# Altium footprint library 3M THD.PcbLib: 163 footprints (part 3 of 14)
Each footprint in its own frame and in the unit in brackets; x right, y up, seen from the top. Pads: shape width x height; smd on the part's side, far side on the other; paste and mask are expansions set on the pad; w line width, h text height; cw(c..) or ccw(c..) is an arc to the next point about the centre after c.
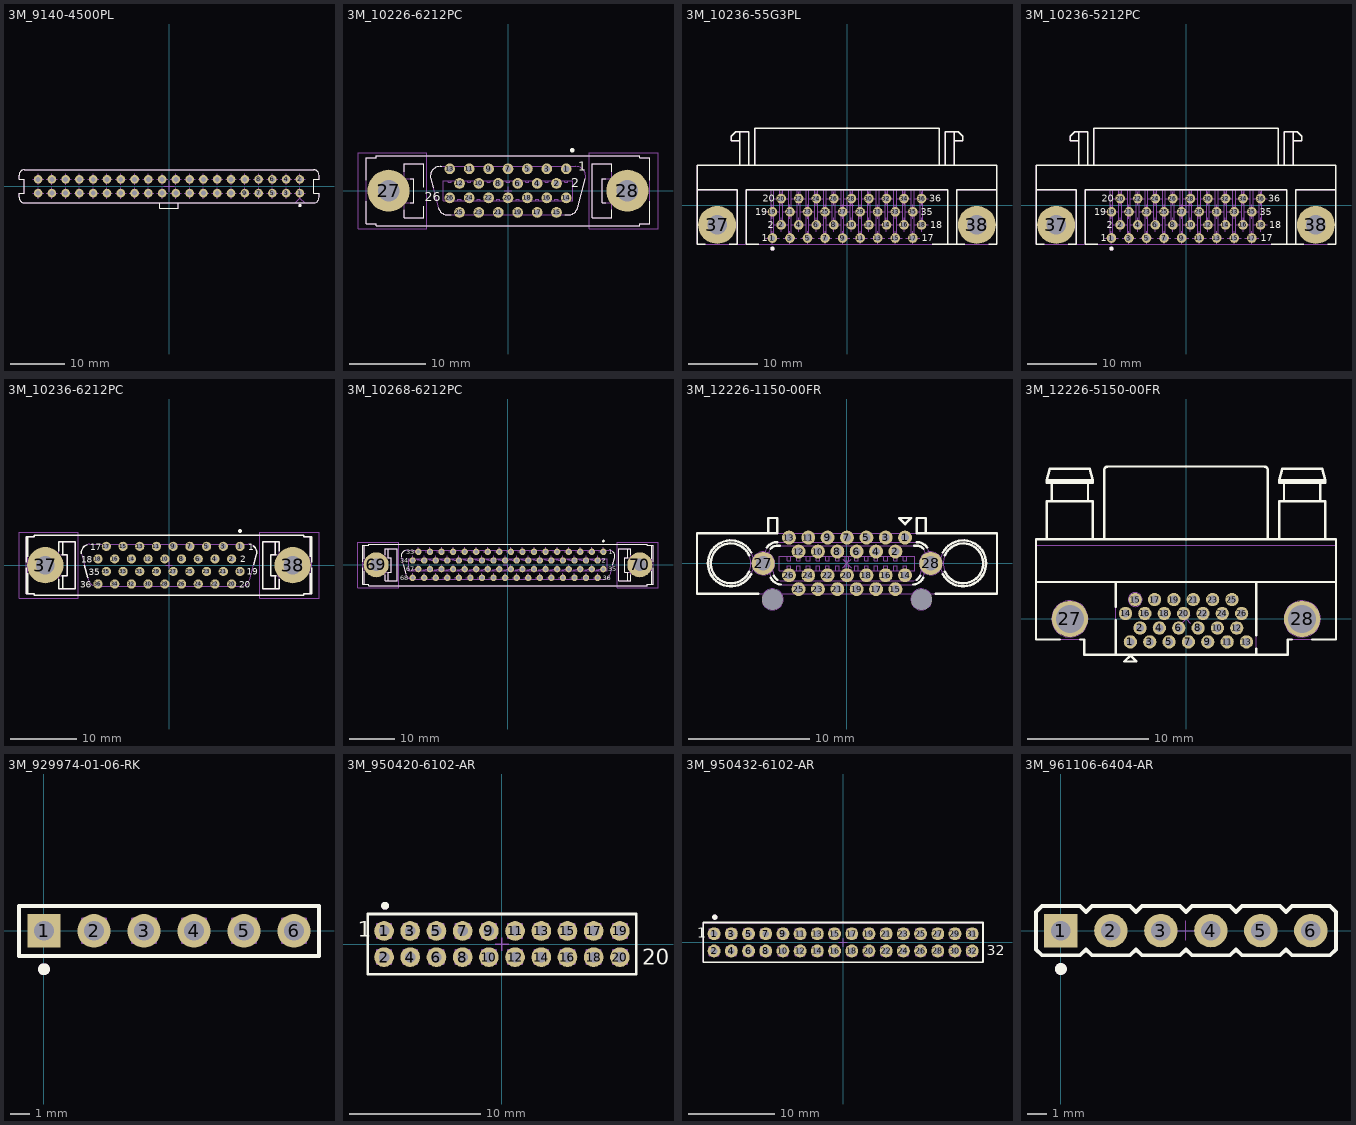
[diagram p2: the footprints below, top view; thin cyan lines are the x and y axes]

## 3M_9140-4500PL [mm] "40 Contacts - Straight .100\" x .100\" Polarized Boardmount Socket, 9100 Series"
height 9
pads (40):
  round 1.6 hole 0.9: 1(24.13,-1.27) 2(24.13,1.27) 3(21.59,-1.27) 4(21.59,1.27) 5(19.05,-1.27) 6(19.05,1.27) 7(16.51,-1.27) 8(16.51,1.27) 9(13.97,-1.27) 10(13.97,1.27) 11(11.43,-1.27) 12(11.43,1.27) 13(8.89,-1.27) 14(8.89,1.27) 15(6.35,-1.27) 16(6.35,1.27) 17(3.81,-1.27) 18(3.81,1.27) 19(1.27,-1.27) 20(1.27,1.27) 21(-1.27,-1.27) 22(-1.27,1.27) 23(-3.81,-1.27) 24(-3.81,1.27) 25(-6.35,-1.27) 26(-6.35,1.27) 27(-8.89,-1.27) 28(-8.89,1.27) 29(-11.43,-1.27) 30(-11.43,1.27) 31(-13.97,-1.27) 32(-13.97,1.27) 33(-16.51,-1.27) 34(-16.51,1.27) 35(-19.05,-1.27) 36(-19.05,1.27) 37(-21.59,-1.27) 38(-21.59,1.27) 39(-24.13,-1.27) 40(-24.13,1.27)
Top Overlay:
  circle w0.3: c24.13,-3.556 r0.15
  lines w0.2: -1.69,-3.05 -1.69,-4.05 1.71,-4.05 1.71,-3.05 ; 23.266,-3.05 24.994,-3.05 ; -27.65,-2.05 ccw(c-26.65,-2.05) -26.65,-3.05 26.65,-3.05 ccw(c26.65,-2.05) 27.65,-2.05 27.65,-1.27 26.65,-1.27 26.65,1.27 27.65,1.27 27.65,2.05 ccw(c26.65,2.05) 26.65,3.05 -26.65,3.05 ccw(c-26.65,2.05) -27.65,2.05 -27.65,1.27 -26.65,1.27 -26.65,-1.27 -27.65,-1.27 ; -27.65,-2.05 -27.65,-1.27 ; -27.65,-2.05 -27.65,-1.27
Mechanical 8:
  drawing of 164 lines, arcs and shapes, not listed
Mechanical 14:
  circle w0.3: c24.13,-3.556 r0.15
  lines w0.1: -1.69,-3.05 -1.69,-4.05 1.71,-4.05 1.71,-3.05 ; 23.266,-3.05 24.13,-2.186 24.994,-3.05 ; -27.65,-2.05 ccw(c-26.65,-2.05) -26.65,-3.05 26.65,-3.05 ccw(c26.65,-2.05) 27.65,-2.05 27.65,-1.27 26.65,-1.27 26.65,1.27 27.65,1.27 27.65,2.05 ccw(c26.65,2.05) 26.65,3.05 -26.65,3.05 ccw(c-26.65,2.05) -27.65,2.05 -27.65,1.27 -26.65,1.27 -26.65,-1.27 -27.65,-1.27 ; -27.65,-2.05 -27.65,-1.27 ; -27.65,-2.05 -27.65,-1.27
3D body "3M_9140-4500PL.stp": height 9, standoff -2.8, extent -27.65,-4.05 27.65,3.05

## 3M_10226-6212PC [mm] "26 contacts, Mini D Ribbon (MDR), .050\" Boardmount Through-hole Vertical Receptacle - Shielded"
height 11
pads (28):
  round 1.4 hole 0.8: 1(7.62,2.86) 2(6.35,0.955) 3(5.08,2.86) 4(3.81,0.955) 5(2.54,2.86) 6(1.27,0.955) 7(0,2.86) 8(-1.27,0.955) 9(-2.54,2.86) 10(-3.81,0.955) 11(-5.08,2.86) 12(-6.35,0.955) 13(-7.62,2.86) 14(7.62,-0.94) 15(6.35,-2.84) 16(5.08,-0.94) 17(3.81,-2.84) 18(2.54,-0.94) 19(1.27,-2.84) 20(0,-0.94) 21(-1.27,-2.84) 22(-2.54,-0.94) 23(-3.81,-2.84) 24(-5.08,-0.94) 25(-6.35,-2.84) 26(-7.62,-0.94)
  round 5.5 hole 2.8: 27(-15.63,0) 28(15.63,0)
Top Overlay:
  circle w0.3: c8.4,5.3 r0.15
  lines w0.1: -18.542,-1.4 -18.542,-4.318 -17.272,-4.318 -17.272,-4.572 17.272,-4.572 17.272,-4.318 18.542,-4.318 18.542,-1.4 ; -18.542,1.4 -18.542,4.318 -17.272,4.318 -17.272,4.572 17.272,4.572 17.272,4.318 18.542,4.318 18.542,1.4 ; -13.589,-2.5 -13.589,-3.556 -11.049,-3.556 -11.049,-2 ; -13.589,2.5 -13.589,3.556 -11.049,3.556 -11.049,0.424 ; -12.8,-1.587 -12.319,-1.587 -12.319,1.587 -12.8,1.587 ; -9.795,0.375 -10.117,1.576 cw(c-8.89,1.905) -8.89,3.175 -8.674,3.175 ; -9.096,-2.234 ccw(c-7.869,-1.905) -7.869,-3.175 -7.402,-3.175 ; 7.402,-3.175 7.869,-3.175 ccw(c7.869,-1.905) 9.096,-2.234 10.117,1.576 ; 12.8,-1.587 12.319,-1.587 12.319,1.587 12.8,1.587 ; 13.589,-2.5 13.589,-3.556 11.049,-3.556 11.049,3.556 13.589,3.556 13.589,2.5
  text "26" at -10.9,-1.4 h1.2
  text "2" at 8.3,0.455 h1.2
  text "1" at 9.2,2.6 h1.2
Mechanical 8:
  circle w0.1: c-15.63,0 r1.4
  circle w0.1: c15.63,0 r1.4
  lines w0.1: -16.13,0 -15.63,0 ; -15.63,-0.5 -15.63,0 ; -15.63,0.5 -15.63,0 ; -15.13,0 -15.63,0 ; -8.12,-0.95 -7.62,-0.95 ; -8.12,2.86 -7.62,2.86 ; -7.62,-1.45 -7.62,-0.95 ; -7.62,-0.45 -7.62,-0.95 ; -7.62,2.36 -7.62,2.86 ; -7.62,3.36 -7.62,2.86 ; -7.12,-0.95 -7.62,-0.95 ; -7.12,2.86 -7.62,2.86 ; -6.85,-2.855 -6.35,-2.855 ; -6.85,0.955 -6.35,0.955 ; -6.35,-3.355 -6.35,-2.855 ; -6.35,-2.355 -6.35,-2.855 ; -6.35,0.455 -6.35,0.955 ; -6.35,1.455 -6.35,0.955 ; -5.85,-2.855 -6.35,-2.855 ; -5.85,0.955 -6.35,0.955 ; -5.58,-0.95 -5.08,-0.95 ; -5.58,2.86 -5.08,2.86 ; -5.08,-1.45 -5.08,-0.95 ; -5.08,-0.45 -5.08,-0.95 ; -5.08,2.36 -5.08,2.86 ; -5.08,3.36 -5.08,2.86 ; -4.58,-0.95 -5.08,-0.95 ; -4.58,2.86 -5.08,2.86 ; -4.31,-2.855 -3.81,-2.855 ; -4.31,0.955 -3.81,0.955 ; -3.81,-3.355 -3.81,-2.855 ; -3.81,-2.355 -3.81,-2.855 ; -3.81,0.455 -3.81,0.955 ; -3.81,1.455 -3.81,0.955 ; -3.31,-2.855 -3.81,-2.855 ; -3.31,0.955 -3.81,0.955 ; -3.04,-0.95 -2.54,-0.95 ; -3.04,2.86 -2.54,2.86 ; -2.54,-1.45 -2.54,-0.95 ; -2.54,-0.45 -2.54,-0.95 ; -2.54,2.36 -2.54,2.86 ; -2.54,3.36 -2.54,2.86 ; -2.04,-0.95 -2.54,-0.95 ; -2.04,2.86 -2.54,2.86 ; -1.77,-2.855 -1.27,-2.855 ; -1.77,0.955 -1.27,0.955 ; -1.27,-3.355 -1.27,-2.855 ; -1.27,-2.355 -1.27,-2.855 ; -1.27,0.455 -1.27,0.955 ; -1.27,1.455 -1.27,0.955 ; -0.77,-2.855 -1.27,-2.855 ; -0.77,0.955 -1.27,0.955 ; -0.5,-0.95 0,-0.95 ; -0.5,0 0,0 ; -0.5,2.86 0,2.86 ; 0,-1.45 0,-0.95 ; 0,-0.5 0,0 ; 0,-0.45 0,-0.95 ; 0,0.5 0,0 ; 0,2.36 0,2.86 ; 0,3.36 0,2.86 ; 0.5,-0.95 0,-0.95 ; 0.5,0 0,0 ; 0.5,2.86 0,2.86 ; 0.77,-2.855 1.27,-2.855 ; 0.77,0.955 1.27,0.955 ; 1.27,-3.355 1.27,-2.855 ; 1.27,-2.355 1.27,-2.855 ; 1.27,0.455 1.27,0.955 ; 1.27,1.455 1.27,0.955 ; 1.77,-2.855 1.27,-2.855 ; 1.77,0.955 1.27,0.955 ; 2.04,-0.95 2.54,-0.95 ; 2.04,2.86 2.54,2.86 ; 2.54,-1.45 2.54,-0.95 ; 2.54,-0.45 2.54,-0.95 ; 2.54,2.36 2.54,2.86 ; 2.54,3.36 2.54,2.86 ; 3.04,-0.95 2.54,-0.95 ; 3.04,2.86 2.54,2.86 ; 3.31,-2.855 3.81,-2.855 ; 3.31,0.955 3.81,0.955 ; 3.81,-3.355 3.81,-2.855 ; 3.81,-2.355 3.81,-2.855 ; 3.81,0.455 3.81,0.955 ; 3.81,1.455 3.81,0.955 ; 4.31,-2.855 3.81,-2.855 ; 4.31,0.955 3.81,0.955 ; 4.58,-0.95 5.08,-0.95 ; 4.58,2.86 5.08,2.86 ; 5.08,-1.45 5.08,-0.95 ; 5.08,-0.45 5.08,-0.95 ; 5.08,2.36 5.08,2.86 ; 5.08,3.36 5.08,2.86 ; 5.58,-0.95 5.08,-0.95 ; 5.58,2.86 5.08,2.86 ; 5.85,-2.855 6.35,-2.855 ; 5.85,0.955 6.35,0.955 ; 6.35,-3.355 6.35,-2.855 ; 6.35,-2.355 6.35,-2.855 ; 6.35,0.455 6.35,0.955 ; 6.35,1.455 6.35,0.955 ; 6.85,-2.855 6.35,-2.855 ; 6.85,0.955 6.35,0.955 ; 7.12,-0.95 7.62,-0.95 ; 7.12,2.86 7.62,2.86 ; 7.62,-1.45 7.62,-0.95 ; 7.62,-0.45 7.62,-0.95 ; 7.62,2.36 7.62,2.86 ; 7.62,3.36 7.62,2.86 ; 8.12,-0.95 7.62,-0.95 ; 8.12,2.86 7.62,2.86 ; 15.13,0 15.63,0 ; 15.63,-0.5 15.63,0 ; 15.63,0.5 15.63,0 ; 16.13,0 15.63,0 ; -19.63,-5 -19.63,5 -10.63,5 -10.63,-5 -19.63,-5 ; 10.63,-5 10.63,5 19.63,5 19.63,-5 10.63,-5
Mechanical 14:
  circle w0.1: c15.621,0 r1.245
  circle w0.1: c-15.621,0 r1.245
  lines w0.1: -11.049,-3.556 -13.589,-3.556 -13.589,-1.587 -12.319,-1.587 -12.319,1.587 -13.589,1.587 -13.589,3.556 -11.049,3.556 ; -7.819,-1.288 -7.819,-1.088 -7.421,-1.088 -7.421,-1.288 ; -7.819,1.288 -7.819,1.088 -7.421,1.088 -7.421,1.288 ; -6.549,-1.288 -6.549,-1.088 -6.151,-1.088 -6.151,-1.288 ; -6.549,1.288 -6.549,1.088 -6.151,1.088 -6.151,1.288 ; -5.279,-1.288 -5.279,-1.088 -4.881,-1.088 -4.881,-1.288 ; -5.279,1.288 -5.279,1.088 -4.881,1.088 -4.881,1.288 ; -4.009,-1.288 -4.009,-1.088 -3.611,-1.088 -3.611,-1.288 ; -4.009,1.288 -4.009,1.088 -3.611,1.088 -3.611,1.288 ; -2.739,-1.288 -2.739,-1.088 -2.341,-1.088 -2.341,-1.288 ; -2.739,1.288 -2.739,1.088 -2.341,1.088 -2.341,1.288 ; -1.469,-1.288 -1.469,-1.088 -1.071,-1.088 -1.071,-1.288 ; -1.469,1.288 -1.469,1.088 -1.071,1.088 -1.071,1.288 ; -0.199,-1.288 -0.199,-1.088 0.199,-1.088 0.199,-1.288 ; -0.199,1.288 -0.199,1.088 0.199,1.088 0.199,1.288 ; 1.071,-1.288 1.071,-1.088 1.469,-1.088 1.469,-1.288 ; 1.071,1.288 1.071,1.088 1.469,1.088 1.469,1.288 ; 2.341,-1.288 2.341,-1.088 2.739,-1.088 2.739,-1.288 ; 2.341,1.288 2.341,1.088 2.739,1.088 2.739,1.288 ; 3.611,-1.288 3.611,-1.088 4.009,-1.088 4.009,-1.288 ; 3.611,1.288 3.611,1.088 4.009,1.088 4.009,1.288 ; 4.881,-1.288 4.881,-1.088 5.279,-1.088 5.279,-1.288 ; 4.881,1.288 4.881,1.088 5.279,1.088 5.279,1.288 ; 6.151,-1.288 6.151,-1.088 6.549,-1.088 6.549,-1.288 ; 6.151,1.288 6.151,1.088 6.549,1.088 6.549,1.288 ; 7.421,-1.288 7.421,-1.088 7.819,-1.088 7.819,-1.288 ; 7.421,1.288 7.421,1.088 7.819,1.088 7.819,1.288 ; 10.117,1.576 ccw(c8.89,1.905) 8.89,3.175 -8.89,3.175 ccw(c-8.89,1.905) -10.117,1.576 -9.096,-2.234 ccw(c-7.869,-1.905) -7.869,-3.175 7.869,-3.175 ccw(c7.869,-1.905) 9.096,-2.234 10.147,1.688 ; -18.542,-4.318 -17.272,-4.318 -17.272,-4.572 17.272,-4.572 17.272,-4.318 18.542,-4.318 18.542,4.318 17.272,4.318 17.272,4.572 -17.272,4.572 -17.272,4.318 -18.542,4.318 -18.542,-4.318 ; -8.491,-1.288 -8.491,1.288 8.491,1.288 8.491,-1.288 -8.491,-1.288 ; 11.049,-3.556 13.589,-3.556 13.589,-1.587 12.319,-1.587 12.319,1.587 13.589,1.587 13.589,3.556 11.049,3.556 11.049,-3.556
3D body "3M_10226-6212PC.stp": height 11.18, standoff -3.4, extent -18.542,-4.572 18.542,4.572

## 3M_10236-55G3PL [mm] "36 contacts, Mini D Ribbon (MDR), 102 Series, .050\" Boardmount Through-hole Right Angle Receptacle-Shielded"
height 9.4
pads (38):
  round 1.4 hole 0.8: 1(-10.795,-4.758) 2(-9.525,-2.853) 3(-8.255,-4.758) 4(-6.985,-2.853) 5(-5.715,-4.758) 6(-4.445,-2.853) 7(-3.175,-4.758) 8(-1.905,-2.853) 9(-0.635,-4.758) 10(0.635,-2.853) 11(1.905,-4.758) 12(3.175,-2.853) 13(4.445,-4.758) 14(5.715,-2.853) 15(6.985,-4.758) 16(8.255,-2.853) 17(9.525,-4.758) 18(10.795,-2.853) 19(-10.795,-0.957) 20(-9.525,0.957) 21(-8.255,-0.957) 22(-6.985,0.957) 23(-5.715,-0.957) 24(-4.445,0.957) 25(-3.175,-0.957) 26(-1.905,0.957) 27(-0.635,-0.957) 28(0.635,0.957) 29(1.905,-0.957) 30(3.175,0.957) 31(4.445,-0.957) 32(5.715,0.957) 33(6.985,-0.957) 34(8.255,0.957) 35(9.525,-0.957) 36(10.795,0.957)
  round 5.5 hole 2.8: 37(-18.796,-2.853) 38(18.796,-2.853)
Top Overlay:
  circle w0.3: c-10.795,-6.282 r0.15
  lines w0.2: -21.717,2.227 -15.875,2.227 -15.875,-5.647 -17.084,-5.647 ; -20.508,-5.647 -21.717,-5.647 -21.717,5.783 21.717,5.783 21.717,-5.647 20.508,-5.647 ; -15.494,5.783 -15.494,10.609 ; -15.494,9.339 -16.764,9.339 -16.764,9.974 -16.129,10.609 -14.224,10.609 -14.224,5.783 ; -13.335,5.783 -13.335,11.117 13.334,11.117 13.336,5.783 ; -12.77,-5.647 -14.605,-5.647 -14.605,2.227 14.605,2.227 14.605,-5.647 ; 12.349,-5.647 15.875,-5.647 ; 14.224,5.783 14.224,10.609 16.129,10.609 16.764,9.974 16.764,9.339 15.494,9.339 ; 15.494,5.783 15.494,10.609 ; 17.084,-5.647 15.875,-5.647 ; 21.717,2.227 15.875,2.227 15.875,-5.647
  text "1" at -12.365,-5.242 h1.02
  text "2" at -11.495,-3.337 h1.02
  text "20" at -12.195,0.473 h1.02
  text "19" at -13.315,-1.441 h1.02
  text "35" at 10.675,-1.446 h1.02
  text "17" at 10.8,-5.247 h1.02
  text "18" at 12.06,-3.342 h1.02
  text "36" at 11.935,0.468 h1.02
Mechanical 8:
  drawing of 156 lines, arcs and shapes, not listed
Mechanical 14:
  circle w0.3: c-10.795,-6.282 r0.15
  lines w0.1: -21.717,2.227 -15.875,2.227 -15.875,-5.647 ; -15.494,5.783 -15.494,10.609 ; -15.494,9.339 -16.764,9.339 -16.764,9.974 -16.129,10.609 -14.224,10.609 -14.224,5.783 ; -14.605,-5.647 -14.605,2.227 14.605,2.227 14.605,-5.647 ; -13.335,5.783 -13.335,11.117 13.334,11.117 13.336,5.783 ; -10.994,2.227 -10.994,-4.957 -10.596,-4.957 -10.596,2.227 ; -9.724,2.227 -9.724,-3.052 -9.326,-3.052 -9.326,2.227 ; -8.454,2.227 -8.454,-4.957 -8.056,-4.957 -8.056,2.227 ; -7.184,2.227 -7.184,-3.052 -6.786,-3.052 -6.786,2.227 ; -5.914,2.227 -5.914,-4.957 -5.516,-4.957 -5.516,2.227 ; -4.644,2.227 -4.644,-3.052 -4.246,-3.052 -4.246,2.227 ; -3.374,2.227 -3.374,-4.957 -2.976,-4.957 -2.976,2.227 ; -2.104,2.227 -2.104,-3.052 -1.706,-3.052 -1.706,2.227 ; -0.834,2.227 -0.834,-4.957 -0.436,-4.957 -0.436,2.227 ; 0.436,2.227 0.436,-3.052 0.834,-3.052 0.834,2.227 ; 1.706,2.227 1.706,-4.957 2.104,-4.957 2.104,2.227 ; 2.976,2.227 2.976,-3.052 3.374,-3.052 3.374,2.227 ; 4.246,2.227 4.246,-4.957 4.644,-4.957 4.644,2.227 ; 5.516,2.227 5.516,-3.052 5.914,-3.052 5.914,2.227 ; 6.786,2.227 6.786,-4.957 7.184,-4.957 7.184,2.227 ; 8.056,2.227 8.056,-3.052 8.454,-3.052 8.454,2.227 ; 9.326,2.227 9.326,-4.957 9.724,-4.957 9.724,2.227 ; 10.596,2.227 10.596,-3.052 10.994,-3.052 10.994,2.227 ; 14.224,5.783 14.224,10.609 16.129,10.609 16.764,9.974 16.764,9.339 15.494,9.339 ; 15.494,5.783 15.494,10.609 ; 15.875,-5.647 15.875,2.227 21.717,2.227 ; -21.717,-5.647 21.717,-5.647 21.717,5.783 -21.717,5.783 -21.717,-5.647 ; -19.05,-5.031 -18.542,-5.031 -18.542,-4.071 ccw(c-18.796,-2.853) -18.542,-1.634 -18.542,-0.675 -19.05,-0.675 -19.05,-1.634 ccw(c-18.796,-2.853) -19.05,-4.071 -19.05,-5.031 ; 18.542,-5.031 19.05,-5.031 19.05,-4.071 ccw(c18.796,-2.853) 19.05,-1.634 19.05,-0.675 18.542,-0.675 18.542,-1.634 ccw(c18.796,-2.853) 18.542,-4.071 18.542,-5.031
  text "1" at -12.365,-5.242 h1.02
  text "2" at -11.495,-3.337 h1.02
  text "20" at -12.195,0.473 h1.02
  text "19" at -13.315,-1.441 h1.02
  text "35" at 10.675,-1.446 h1.02
  text "17" at 10.8,-5.247 h1.02
  text "18" at 12.06,-3.342 h1.02
  text "36" at 11.935,0.468 h1.02
3D body "3M_10236-55G3PL.stp": height 9.4, standoff -3.81, extent -21.717,-5.647 21.717,11.117

## 3M_10236-5212PC [mm] "36 contacts, Mini D Ribbon (MDR), 102 Series, .050\" Boardmount Through-hole Right Angle Receptacle-Shielded"
height 9.4
pads (38):
  round 1.4 hole 0.8: 1(-10.795,-4.758) 2(-9.525,-2.853) 3(-8.255,-4.758) 4(-6.985,-2.853) 5(-5.715,-4.758) 6(-4.445,-2.853) 7(-3.175,-4.758) 8(-1.905,-2.853) 9(-0.635,-4.758) 10(0.635,-2.853) 11(1.905,-4.758) 12(3.175,-2.853) 13(4.445,-4.758) 14(5.715,-2.853) 15(6.985,-4.758) 16(8.255,-2.853) 17(9.525,-4.758) 18(10.795,-2.853) 19(-10.795,-0.957) 20(-9.525,0.957) 21(-8.255,-0.957) 22(-6.985,0.957) 23(-5.715,-0.957) 24(-4.445,0.957) 25(-3.175,-0.957) 26(-1.905,0.957) 27(-0.635,-0.957) 28(0.635,0.957) 29(1.905,-0.957) 30(3.175,0.957) 31(4.445,-0.957) 32(5.715,0.957) 33(6.985,-0.957) 34(8.255,0.957) 35(9.525,-0.957) 36(10.795,0.957)
  round 5.5 hole 2.8: 37(-18.796,-2.853) 38(18.796,-2.853)
Top Overlay:
  circle w0.3: c-10.795,-6.282 r0.15
  lines w0.2: -21.717,2.227 -15.875,2.227 -15.875,-5.647 -17.084,-5.647 ; -20.508,-5.647 -21.717,-5.647 -21.717,5.783 21.717,5.783 21.717,-5.647 20.508,-5.647 ; -15.494,5.783 -15.494,10.609 ; -15.494,9.339 -16.764,9.339 -16.764,9.974 -16.129,10.609 -14.224,10.609 -14.224,5.783 ; -13.335,5.783 -13.335,11.117 13.334,11.117 13.336,5.783 ; -12.77,-5.647 -14.605,-5.647 -14.605,2.227 14.605,2.227 14.605,-5.647 ; 12.349,-5.647 15.875,-5.647 ; 14.224,5.783 14.224,10.609 16.129,10.609 16.764,9.974 16.764,9.339 15.494,9.339 ; 15.494,5.783 15.494,10.609 ; 17.084,-5.647 15.875,-5.647 ; 21.717,2.227 15.875,2.227 15.875,-5.647
  text "1" at -12.365,-5.242 h1.02
  text "2" at -11.495,-3.337 h1.02
  text "20" at -12.195,0.473 h1.02
  text "19" at -13.315,-1.441 h1.02
  text "35" at 10.675,-1.446 h1.02
  text "17" at 10.8,-5.247 h1.02
  text "18" at 12.06,-3.342 h1.02
  text "36" at 11.935,0.468 h1.02
Mechanical 8:
  drawing of 156 lines, arcs and shapes, not listed
Mechanical 14:
  circle w0.3: c-10.795,-6.282 r0.15
  lines w0.1: -21.717,2.227 -15.875,2.227 -15.875,-5.647 ; -15.494,5.783 -15.494,10.609 ; -15.494,9.339 -16.764,9.339 -16.764,9.974 -16.129,10.609 -14.224,10.609 -14.224,5.783 ; -14.605,-5.647 -14.605,2.227 14.605,2.227 14.605,-5.647 ; -13.335,5.783 -13.335,11.117 13.334,11.117 13.336,5.783 ; -10.994,2.227 -10.994,-4.957 -10.596,-4.957 -10.596,2.227 ; -9.724,2.227 -9.724,-3.052 -9.326,-3.052 -9.326,2.227 ; -8.454,2.227 -8.454,-4.957 -8.056,-4.957 -8.056,2.227 ; -7.184,2.227 -7.184,-3.052 -6.786,-3.052 -6.786,2.227 ; -5.914,2.227 -5.914,-4.957 -5.516,-4.957 -5.516,2.227 ; -4.644,2.227 -4.644,-3.052 -4.246,-3.052 -4.246,2.227 ; -3.374,2.227 -3.374,-4.957 -2.976,-4.957 -2.976,2.227 ; -2.104,2.227 -2.104,-3.052 -1.706,-3.052 -1.706,2.227 ; -0.834,2.227 -0.834,-4.957 -0.436,-4.957 -0.436,2.227 ; 0.436,2.227 0.436,-3.052 0.834,-3.052 0.834,2.227 ; 1.706,2.227 1.706,-4.957 2.104,-4.957 2.104,2.227 ; 2.976,2.227 2.976,-3.052 3.374,-3.052 3.374,2.227 ; 4.246,2.227 4.246,-4.957 4.644,-4.957 4.644,2.227 ; 5.516,2.227 5.516,-3.052 5.914,-3.052 5.914,2.227 ; 6.786,2.227 6.786,-4.957 7.184,-4.957 7.184,2.227 ; 8.056,2.227 8.056,-3.052 8.454,-3.052 8.454,2.227 ; 9.326,2.227 9.326,-4.957 9.724,-4.957 9.724,2.227 ; 10.596,2.227 10.596,-3.052 10.994,-3.052 10.994,2.227 ; 14.224,5.783 14.224,10.609 16.129,10.609 16.764,9.974 16.764,9.339 15.494,9.339 ; 15.494,5.783 15.494,10.609 ; 15.875,-5.647 15.875,2.227 21.717,2.227 ; -21.717,-5.647 21.717,-5.647 21.717,5.783 -21.717,5.783 -21.717,-5.647 ; -19.05,-5.031 -18.542,-5.031 -18.542,-4.071 ccw(c-18.796,-2.853) -18.542,-1.634 -18.542,-0.675 -19.05,-0.675 -19.05,-1.634 ccw(c-18.796,-2.853) -19.05,-4.071 -19.05,-5.031 ; 18.542,-5.031 19.05,-5.031 19.05,-4.071 ccw(c18.796,-2.853) 19.05,-1.634 19.05,-0.675 18.542,-0.675 18.542,-1.634 ccw(c18.796,-2.853) 18.542,-4.071 18.542,-5.031
  text "1" at -12.365,-5.242 h1.02
  text "2" at -11.495,-3.337 h1.02
  text "20" at -12.195,0.473 h1.02
  text "19" at -13.315,-1.441 h1.02
  text "35" at 10.675,-1.446 h1.02
  text "17" at 10.8,-5.247 h1.02
  text "18" at 12.06,-3.342 h1.02
  text "36" at 11.935,0.468 h1.02
3D body "3M_10236-5212PC.stp": height 9.4, standoff -3.81, extent -21.717,-5.647 21.717,11.117

## 3M_10236-6212PC [mm] "36 contacts, Mini D Ribbon (MDR), 102 Series, .050\" Boardmount Through-hole Vertical Receptacle-Shielded"
height 9.4
pads (38):
  round 1.4 hole 0.8: 1(10.795,2.86) 2(9.525,0.955) 3(8.255,2.86) 4(6.985,0.955) 5(5.715,2.86) 6(4.445,0.955) 7(3.175,2.86) 8(1.905,0.955) 9(0.635,2.86) 10(-0.635,0.955) 11(-1.905,2.86) 12(-3.175,0.955) 13(-4.445,2.86) 14(-5.715,0.955) 15(-6.985,2.86) 16(-8.255,0.955) 17(-9.525,2.86) 18(-10.795,0.955) 19(10.795,-0.955) 20(9.525,-2.86) 21(8.255,-0.955) 22(6.985,-2.86) 23(5.715,-0.955) 24(4.445,-2.86) 25(3.175,-0.955) 26(1.905,-2.86) 27(0.635,-0.955) 28(-0.635,-2.86) 29(-1.905,-0.955) 30(-3.175,-2.86) 31(-4.445,-0.955) 32(-5.715,-2.86) 33(-6.985,-0.955) 34(-8.255,-2.86) 35(-9.525,-0.955) 36(-10.795,-2.86)
  round 5.5 hole 2.8: 37(-18.796,0) 38(18.796,0)
Top Overlay:
  circle w0.3: c10.795,5.207 r0.15
  lines w0.2: -21.717,-0.413 -21.717,-4.318 -20.447,-4.318 -20.447,-4.572 20.447,-4.572 20.447,-4.318 21.717,-4.318 21.717,-0.413 ; -21.717,0.413 -21.717,4.318 -20.447,4.318 -20.447,4.572 20.447,4.572 20.447,4.318 21.717,4.318 21.717,0.413 ; -21.463,-4.318 -21.463,-1.261 ; -21.463,1.261 -21.463,4.318 ; -16.764,-2.139 -16.764,-3.556 -14.224,-3.556 -14.224,3.556 -16.764,3.556 -16.764,2.139 ; -16.31,-1.587 -15.494,-1.587 -15.494,1.587 -16.31,1.587 ; -16.129,-3.556 -16.129,-1.587 ; -16.129,1.587 -16.129,3.556 ; -13.323,1.725 cw(c-12.065,1.896) -12.392,3.123 ; -12.86,-0.044 -12.355,-1.928 ; 12.811,2.933 cw(c12.065,1.905) 13.292,1.576 12.878,0.032 ; 16.129,-3.556 16.129,-1.587 ; 16.129,1.587 16.129,3.556 ; 16.31,-1.587 15.494,-1.587 15.494,1.587 16.31,1.587 ; 16.764,-2.139 16.764,-3.556 14.224,-3.556 14.224,3.556 16.764,3.556 16.764,2.139 ; 21.463,-4.318 21.463,-1.261 ; 21.463,1.261 21.463,4.318
  text "36" at -13.465,-3.464 h1.02
  text "18" at -13.34,0.336 h1.02
  text "17" at -11.933,2.241 h1.02
  text "35" at -12.185,-1.569 h1.02
  text "19" at 11.831,-1.436 h1.02
  text "20" at 10.665,-3.459 h1.02
  text "2" at 10.857,0.468 h1.02
  text "1" at 12.019,2.246 h1.02
Mechanical 8:
  drawing of 164 lines, arcs and shapes, not listed
Mechanical 14:
  circle w0.1: c18.796,0 r1.245
  circle w0.1: c-18.796,0 r1.245
  lines w0.1: -21.463,-4.318 -21.463,4.318 ; -16.129,-3.556 -16.129,-1.587 ; -16.129,1.587 -16.129,3.556 ; 16.129,-3.556 16.129,-1.587 ; 16.129,1.587 16.129,3.556 ; 21.463,-4.318 21.463,4.318 ; -21.717,-4.318 -20.447,-4.318 -20.447,-4.572 20.447,-4.572 20.447,-4.318 21.717,-4.318 21.717,4.318 20.447,4.318 20.447,4.572 -20.447,4.572 -20.447,4.318 -21.717,4.318 -21.717,-4.318 ; -16.764,-3.556 -14.224,-3.556 -14.224,3.556 -16.764,3.556 -16.764,1.587 -15.494,1.587 -15.494,-1.587 -16.764,-1.587 -16.764,-3.556 ; -13.292,1.576 cw(c-12.065,1.905) -12.065,3.175 12.065,3.175 cw(c12.065,1.905) 13.292,1.576 12.286,-2.178 cw(c11.015,-1.868) 10.987,-3.175 -10.987,-3.175 cw(c-11.015,-1.868) -12.286,-2.178 -13.292,1.576 ; 14.224,-3.556 16.764,-3.556 16.764,-1.587 15.494,-1.587 15.494,1.587 16.764,1.587 16.764,3.556 14.224,3.556 14.224,-3.556
  text "19" at 11.831,-1.436 h1.02
  text "20" at 10.665,-3.459 h1.02
  text "2" at 10.857,0.468 h1.02
  text "1" at 12.019,2.246 h1.02
  text "36" at -13.465,-3.464 h1.02
  text "18" at -13.34,0.336 h1.02
  text "17" at -11.933,2.241 h1.02
  text "35" at -12.185,-1.569 h1.02
3D body "3M_10236-6212PC.stp": height 11.18, standoff -3.4, extent -21.717,-4.572 21.717,4.572
